# Altium schematic symbol library AA_Symbols.SchLib: 1017 symbols (part 5 of 7) (continued)
## Ind_Choke_CM_0.8A_310ohm_744222
designator L?, comment Manufacturer P/N: 744222  (hidden comment: 6k@100KHz, 0.8A)
Inductor, Choke, Common Mode, 800mA, 6000 Ohm, 744222; Manufacturer: Wurth Electronics; Outset P/N: PN-0001703; Value: 6k@100KHz, 0.8A
footprint 744222_CM_Choke (Chip Choke CM, Wurth, 744222)
pins: 1, 2, 3, 4

## Ind_Choke_CM_0.17A_35ohm_DLP11SA350HL2L
designator L?, comment Manufacturer P/N: DLP11SA350HL2L  (hidden comment: 35R@100MHz, 0.17A)
Inductor, Choke, Common Mode, 170mA, 35 Ohm, DLP11SA350HL2L; Manufacturer: Murata; Outset P/N: PN-0002774; Value: 35R@100MHz, 0.17A
footprint DFN125X100X92-4N (DFN,0.55mm pitch;4 pin,1.25mm L X 1.00mm W X 0.92mm H)
pins: 1, 2, 3, 4

## Ind_Choke_CM_1.5A_1000ohm_SRF0504-102Y
designator L?, comment SRF0504-102Y
Inductor, Choke, Common Mode, 1.5A, 1000 Ohm, SRF0504-102Y; Manufacturer: Bourns; Value: 1k@100KHz, 1.5A; Outset P/N: PN-0001658; Manufacturer P/N: SRF0504-102Y
footprint SRF0504 (SRF0504, 3.10 X 2.15 mm pitch; 4 pin, 5.00 mm L X 4.80 mm W X 4.70 mm H body)
pins: 1 IN1, 2 IN2, 3 OUT2, 4 OUT1

## Ind_Choke_CM_1.7A_1400ohm_4520
designator L?, comment ACM4520-142
Inductor, Choke, Common Mode, 1.7A, 1400 Ohm, 4520; Manufacturer: TDK; Manufacturer P/N: ACM4520-142-2P-T000; Outset P/N: 0000184
footprint ACM4520 (Inductor, Choke, Common Mode, 4520)
pins: 1 IN1, 2 IN2, 3 OUT2, 4 OUT1

## Ind_Choke_CM_5A_190ohm_2020
designator L?, comment DLW5BSN191SQ2L
Inductor, Choke, Common Mode, 5A, 190 Ohm, 2020; Manufacturer: Murata Electronics North America; Outset P/N: 0000187; Manufacturer P/N: DLW5BSN191SQ2L
footprint DLW5BS (SMD Ferrite Bead)
pins: 1 IN1, 2 OUT1, 3 OUT2, 4 IN2

## Ind_Choke_CM_5A_190ohm_SRF0504-102Y
designator L?, comment SRF0504-191Y
Inductor, Choke, Common Mode, 5A, 190 Ohm, SRF0504-191Y; Manufacturer: Bourns; Value: 190R@100KHz, 5A; Outset P/N: PN-0001833; Manufacturer P/N: SRF0504-191Y
footprint SRF0504 (SRF0504, 3.10 X 2.15 mm pitch; 4 pin, 5.00 mm L X 4.80 mm W X 4.70 mm H body)
pins: 1 IN1, 2 IN2, 3 OUT2, 4 OUT1

## Ind_Choke_CM_14.5A_4mH_8119
designator L?, comment CMT-8119 4mH 14.5A
Inductor, Choke, Common Mode, 14.5A, 4mH, 8119; Manufacturer: Bourns Inc.; Manufacturer P/N: 8119-RC; Value: 4 mH, 14.5A; Outset P/N: 0000185
footprint INDUCTOR_CMT8121 (Power Inductor)
pins: 1 IN1, 2 IN2, 3 OUT3, 4 OUT4

## INDUCTOR CHOKE RF HI CURR 820UH 10% RAD
designator L?, comment 820UH
Inductor, CHOKE RF HI CURR 820UH 10% RAD; Manufacturer: JW Miller A Bourns Company; Manufacturer P/N: 1140-821K-RC; Outset P/N: 0000176; Value: 820UH
footprint Choke_TH_1140-821K (Bourns, high current choke, 1140 series)
pins: 1, 2

## JUMPER
designator M?, comment SPC02SYAN  (mechanical)
2 (1 x 2) Position Shunt Connector Black Closed Top 0.100" (2.54mm) Gold; Manufacturer: Sullins Connector Solutions; Outset P/N: PN-0008392; Manufacturer P/N: 2 (1 x 2) Position Shunt Connector Black Closed Top 0.100" (2.54mm) Gold; Value: SPC02SYAN

## JUMPER_1
designator M?, comment SPC02SYAN  (mechanical)
2 (1 x 2) Position Shunt Connector Black Closed Top 0.100" (2.54mm) Gold; Manufacturer: Sullins Connector Solutions; Manufacturer P/N: 2 (1 x 2) Position Shunt Connector Black Closed Top 0.100" (2.54mm) Gold; Value: SPC02SYAN

## LED_Green_35mcd_2V_20mA_0603
designator D?, comment LTST-C191KGKT
LED, Green, 35mcd, 2V, 20mA; Manufacturer: Lite-On Inc; Outset P/N: 0000188; Manufacturer P/N: LTST-C191KGKT
footprint 0603_LED
pins: 1 A, 2 K

## LED_GRN_50mcd_2.2V_25mA_Thru
designator LED?, comment 50mcd, GRN
LED, Green, 50mcd, 2.2V, 25mA; Manufacturer: Lumex; Manufacturer P/N: SSF-LXH2300LGD-LM; Outset P/N: PN-0001661; Value: 50mcd, GRN
footprint NUV_SSF-LXH2300XXD-LM_TH2.25mm2pin (LED, 2.25 mm pitch; 2 pin,  11.00 mm L X 6.00 mm W X 7.1 mm H body)
footprint SSF-LXH2300LGD-LM_TH2.25mm2pin (LED, 2.25 mm pitch; 2 pin,  11.00 mm L X 6.00 mm W X 7.1 mm H body)
pins: 1 A, 2 K

## LED_GRN_SSF-LXH303GD
designator LED?, comment SSF-LXH303GD
LED T-3MM 565NM GREEN DIFF PCB, TH RA; Manufacturer: Lumex; Outset P/N: PN-0001687; Manufacturer P/N: SSF-LXH303GD; Value: SSF-LXH303GD
footprint LED_GRN_SSF-LXH303GD (TH, RA, LED)
pins: 1 A, 2 K

## LED_Red_35mcd_2V_20mA_0603
designator D?, comment LTST-C191KRKT
LED, Red, 35mcd, 2V, 20mA; Manufacturer: Lite-On Inc; Outset P/N: 0000189; Manufacturer P/N: LTST-C191KRKT
footprint 0603_LED
pins: 1 A, 2 K

## LED_RED_50mcd_2.0V_25mA_Thru
designator LED?, comment 50mcd, RED
LED, Red, 50mcd, 2.0V, 25mA; Manufacturer: Lumex; Manufacturer P/N: SSF-LXH2300LID-LM; Outset P/N: PN-0001662; Value: 50mcd, RED
footprint SSF-LXH2300LID-LM_TH2.25mm2pin (LED, 2.25 mm pitch; 2 pin,  11.00 mm L X 6.00 mm W X 7.1 mm H body)
pins: 1 A, 2 K

## LED_RED_SSF-LXH303ID
designator LED?, comment SSF-LXH303ID
LED T-3MM 635NM RED DIFF PCB, TH RA; Manufacturer: Lumex; Outset P/N: PN-0001686; Manufacturer P/N: SSF-LXH303ID; Value: SSF-LXH303ID
footprint LED_RED_SSF-LXH303ID (TH, RA, LED)
pins: 1 A, 2 K

## LED_YEL_50mcd_2.1V_30mA_Thru
designator LED?, comment 50mcd, YEL
LED, Yellow, 50mcd, 2.1V, 30mA; Manufacturer: Lumex; Manufacturer P/N: SSF-LXH2300YD-LM; Outset P/N: PN-0001663; Value: 50mcd, YEL
footprint NUV_SSF-LXH2300YD-LM_TH2.25mm2pin (LED, 2.25 mm pitch; 2 pin,  11.00 mm L X 6.00 mm W X 7.1 mm H body)
footprint SSF-LXH2300YD-LM_TH2.25mm2pin (LED, 2.25 mm pitch; 2 pin,  11.00 mm L X 6.00 mm W X 7.1 mm H body)
pins: 1 A, 2 K

## LED_YEL_5608F7
designator LED?, comment 5608F7
LED T-3MM 583NM YELLOW DIFF PCB, TH RA; Manufacturer: VCC; Outset P/N: PN-0001688; Manufacturer P/N: 5608F7; Value: 5608F7
footprint LED_YEL_VCC5608F7 (TH, RA, LED)
pins: 1 A, 2 K

## MAX_M10S
designator U?, comment MAX-M10S
SparkFun GNSS Receiver Breakout - MAX-M10S (Qwiic); Manufacturer: Sparkfun; Value: MAX-M10S; Manufacturer PN: MAX-M10S; Outset PN: *
pins: MH1, MH2, MH3, MH4

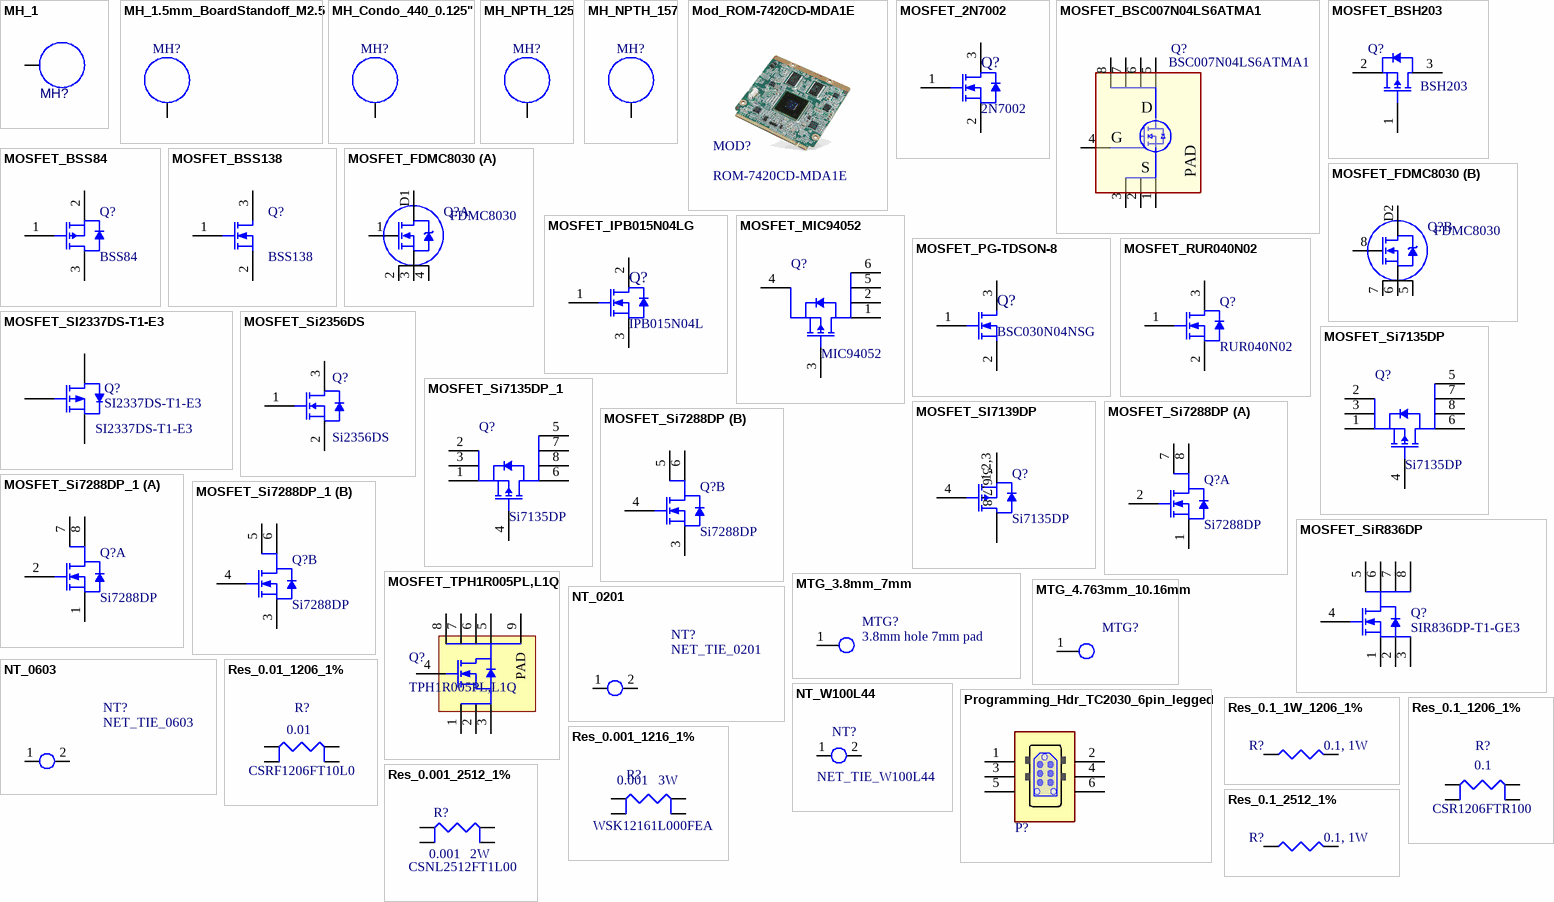
[diagram p29: symbols MH_1 to Res_0.1_2512_1%]

## MH_1
designator MH?  (no BOM)
pins: 1 MH

## MH_1.5mm_BoardStandoff_M2.5
designator MH?  (mechanical)
Mounting Hole, ROUND STANDOFF M2.5 STEEL 1.5MM; Manufacturer: Wurth Electronics; Manufacturer P/N: 9774015151R; Outset P/N: PN-0003780
footprint 9774015151R (ROUND STANDOFF M2.5 STEEL 1.5MM)
pins: 1 MH

## MH_Condo_440_0.125"
designator MH?  (no BOM)
Mounting Hole, Conductivity Sensor, 440 Screw, 0.125" Diameter
footprint MH_CONDO
pins: 1 MH

## MH_NPTH_125
designator MH?  (no BOM)
Mounting Hole, NPTH, 0.157" Diameter; Value: 125 Mils
footprint MH_NPTH_125 (Footprint not found)
pins: 1 MH

## MH_NPTH_157
designator MH?  (no BOM)
Mounting Hole, NPTH, 0.157" Diameter; Value: 157 Mils
footprint MH_NPTH_157 (Mounting Hole NPTH 157 mils)
pins: 1 MH

## Mod_ROM-7420CD-MDA1E
designator MOD?, comment ROM-7420CD-MDA1E  (mechanical)
Module, ROM-7420CD-MDA1E; Manufacturer: Advantech; Outset P/N: PN-0001677; Value: ROM-7420CD-MDA1E; Manufacturer P/N: ROM-7420CD-MDA1E
footprint ROM-7420CD-MDA1E (Footprint not found)

## MOSFET_2N7002
designator Q?, comment 2N7002
MOSFET, N-Channel,  Single, 60V, 115ma, SOT-23; Manufacturer: Fairchild Semiconductor; Outset P/N: 0000190; Manufacturer P/N: 2N7002
footprint SOT-23 (SOT-23; 3 Leads; Body 3.0 x 2.6 mm, inc. leads (LxW max))
pins: 1 G, 2 S, 3 D

## MOSFET_BSC007N04LS6ATMA1
designator Q?, comment BSC007N04LS6ATMA1
MOSFET, N-Channel, 40V, 381A, 188W, 20VGS, 0.7mOhm Max, Surface Mount, PG-TDSON-8-6; Manufacturer: Infineon Technologies; Outset P/N: PN-0007271; VALUE: BSC007N04LS6ATMA1; Temperature: -55C ~ 175C; Manufacturer P/N: BSC007N04LS6ATMA1
footprint BSC007N04LS6ATMA1
pins: 1 S, 2 S, 3 S, 4 G, 5 D, 6 D, 7 D, 8 D
text: PAD

## MOSFET_BSH203
designator Q?, comment BSH203
MOSFET, P-Channel, Single, 30V, 470mA, SOT-23; Manufacturer: NXP; Outset P/N: PN-0001776; Value: BSH203; Manufacturer P/N: BSH203
footprint BSH203 _SOT95P230X110-3L30N (Small Outline Transistor (SOT23), 0.95 mm pitch; 3 pin, 2.90 mm L X 1.30 mm W X 1.10 mm H body)
pins: 1 G, 2 S, 3 D

## MOSFET_BSS84
designator Q?, comment BSS84
MOSFET, P-Channel, Single, 50V, 130ma, SOT-23; Manufacturer: Fairchild Semiconductor; Outset P/N: 0000192; Manufacturer P/N: BSS84
footprint SOT-23 (SOT-23; 3 Leads; Body 3.0 x 2.6 mm, inc. leads (LxW max))
pins: 1 G, 2 S, 3 D

## MOSFET_BSS138
designator Q?, comment BSS138
MOSFET, N-Channel, 50V, 220mA, SOT-23; Manufacturer: Fairchild Semiconductor; Outset P/N: 0000191; Manufacturer P/N: BSS138
footprint SOT-23 (SOT23, 3-Leads, Body 3.0x2.7mm (max), Pitch 0.95mm, IPC Medium Density)
pins: 1, 2, 3

## MOSFET_FDMC8030
designator Q?, comment FDMC8030
MOSFET, 2 N-Channel (Dual), 40V, 12A, 2.8VGS, 10mOhm Max, Surface Mount, 8-PowerWDFN; Manufacturer: ON Semiconductor; Outset P/N: PN-0007281; Temperature: -55C ~ 150C; Manufacturer P/N: FDMC8030; VALUE: FDMC8030
footprint WDFN8_3x3_ONS_MFR
part A pins: 1 G1, 2 S1, 3 S1, 4 S1, D1
part B pins: 5 S2, 6 S2, 7 S2, 8 G2, D2

## MOSFET_IPB015N04LG
designator Q?, comment IPB015N04L
MOSFET, N-Channel,  Single, 40V, 120A, TO263-3; Manufacturer: Infineon; Manufacturer P/N: IPB015N04L G; Outset P/N: 0000193
footprint TO-263-3 (Mosfet N-channel)
pins: 1 G, 2 S, 3 D

## MOSFET_MIC94052
designator Q?, comment MIC94052
MOSFET, P-Channel, Single, 6V, 2A, SC70-6 Power; Manufacturer: Microchip Technology; Manufacturer P/N: MIC94052YC6-TR; Outset P/N: PN-0001738; Value: MIC94052
footprint MIC94052_SOP65P210X110-6L20N (Small Outline Pkg (SOP), 0.65 mm pitch; 6 pin, 2.00 mm L X 1.25 mm W X 1.10 mm H body)
pins: 1 D1, 2 D2, 3 G, 4 S, 5 D3, 6 D4

## MOSFET_PG-TDSON-8
designator Q?, comment BSC030N04NSG
MOSFET, N-Channel,  Single, 40V, 100A, TDSON-8; Manufacturer: Infineon; Outset P/N: 0000194; Manufacturer P/N: BSC030N04NSG
footprint PG-TDSON-8 (SOIC, 8-Leads, Body 6.35x5.35mm, Pitch 1.27mm, IPC Med Density)
pins: 1 G, 2 S, 3 D

## MOSFET_RUR040N02
designator Q?, comment RUR040N02
MOSFET, N-Channel, Single, 20V, 4A, SOT-23; Manufacturer: Rohm Semiconductor; Outset P/N: 0000195; Manufacturer P/N: RUR040N02
footprint SOT-23 (SOT-23; 3 Leads; Body 3.0 x 2.6 mm, inc. leads (LxW max))
pins: 1 G, 2 S, 3 D

## MOSFET_SI2337DS-T1-E3
designator Q?, comment SI2337DS-T1-E3
MOSFET, P-Channel, Single, 80V, 2.2A, SOT23-3; Manufacturer: Vishay Siliconix; Outset P/N: PN-0007131; Manufacturer P/N: SI2337DS-T1-E3; VALUE: SI2337DS-T1-E3
footprint SOT95P240X120-3N (TO-236)
pins: 1 G, 2 S, 3 D

## MOSFET_Si2356DS
designator Q?, comment Si2356DS
MOSFET, N-Channel, Single, 40V, 4A, SOT-23; Manufacturer: Vishay; Manufacturer P/N: SI2356DS-T1-GE3; Value: Si2356DS
footprint SOT-23 (SOT-23; 3 Leads; Body 3.0 x 2.6 mm, inc. leads (LxW max))
pins: 1 G, 2 S, 3 D

## MOSFET_Si7135DP
designator Q?, comment Si7135DP
MOSFET, P-Channel, Single, 30V, 60A, SO-8 Power; Manufacturer: Vishay/Siliconix; Manufacturer P/N: SI7135DP-T1-GE3; Outset P/N: 0000197
footprint SO-8_PowerPaK_single (8 pin, PowerPak)
pins: 1 S1, 2 S2, 3 S3, 4 G, 5 D1, 6 D2, 7 D3, 8 D4

## MOSFET_Si7135DP_1
designator Q?, comment Si7135DP
MOSFET, P-Channel, Single, 30V, 60A, SO-8 Power; Manufacturer: Vishay/Siliconix; Manufacturer P/N: SI7135DP-T1-GE3; Outset P/N: PN-0000197
footprint SO-8_PowerPaK_single (8 pin, PowerPak)
pins: 1 S1, 2 S2, 3 S3, 4 G, 5 D1, 6 D2, 7 D3, 8 D4

## MOSFET_SI7139DP
designator Q?, comment Si7135DP
MOSFET, P-Channel, Single, 30V, 40A, SO-8 Power; Manufacturer: Vishay; Manufacturer P/N: SI7139DP-T1-GE3; Outset P/N: 0000196
footprint SO-8_PowerPaK_single (8 pin, PowerPak)
pins: 1 S1, 2 S2, 3 S3, 4 G, 5 D1, 6 D2, 7 D3, 8 D4
text: 1,2,3; 5,6,7,8

## MOSFET_Si7288DP
designator Q?, comment Si7288DP
MOSFET, N-Channel, Dual, 40V, 20A, SO-8 Power; Manufacturer: Vishay/Siliconix; Manufacturer P/N: SI7288DP-T1-GE3; Outset P/N: 0000198
footprint SO-8_PowerPak (8 pin, PowerPak)
part A pins: 1 S1, 2 G1, 7 D1, 8 D1
part B pins: 3 S2, 4 G2, 5 D2, 6 D2

## MOSFET_Si7288DP_1
designator Q?, comment Si7288DP
MOSFET, N-Channel, Dual, 40V, 20A, SO-8 Power; Manufacturer: Vishay/Siliconix; Manufacturer P/N: SI7288DP-T1-GE3; Outset P/N: PN-0000198
footprint SO-8_PowerPak (8 pin, PowerPak)
part A pins: 1 S1, 2 G1, 7 D1, 8 D1
part B pins: 3 S2, 4 G2, 5 D2, 6 D2

## MOSFET_SiR836DP
designator Q?, comment SIR836DP-T1-GE3
MOSFET, N-Channel, 40V, 21A, SO-8 Power; Manufacturer: Vishay/Siliconix; Outset P/N: PN-0002756; Manufacturer P/N: SIR836DP-T1-GE3; Value: SIR836DP-T1-GE3
footprint SO-8_PowerPaK_single (8 pin, PowerPak)
pins: 1 S1, 2 S1, 3 S1, 4 G1, 5 D1, 6 D1, 7 D1, 8 D1

## MOSFET_TPH1R005PL,L1Q
designator Q?, comment TPH1R005PL,L1Q
MOSFET, N-Channel, Single, 45V, 150A, Surface Mount; Manufacturer: Toshiba; Outset P/N: PN-0001664; Value: TPH1R005PL,L1Q; Manufacturer P/N: TPH1R005PL,L1Q
footprint NUV_TPH1R005PL,L1Q_SOTFL127P600X100-8N (Small Outline Transistor Flat Lead (SOP Advance), 1.27 mm pitch; 8 pin, 5.0 mm L X 5.0 mm W X 1.0 mm H body)
footprint TPH1R005PL,L1Q_SOTFL127P600X100-8N (Small Outline Transistor Flat Lead (SOP Advance), 1.27 mm pitch; 8 pin, 5.0 mm L X 5.0 mm W X 1.0 mm H body)
pins: 1 S, 2 S, 3 S, 4 G, 5 D, 6 D, 7 D, 8 D, 9 PAD

## MTG_3.8mm_7mm
designator MTG?, comment 3.8mm hole 7mm pad  (no BOM)
Mounting hole, 3.8 mm hole, 7 mm pad; Manufacturer: Nuvation; Value: 3.8mm hole 7mm pad
footprint MTG_3.8mm_7.0mm (Mounting hole, 3.8 mm hole,  7mm pad)
pins: 1

## MTG_4.763mm_10.16mm
designator MTG?, comment MTG HOLE  (value not drawn)  (no BOM)
Mounting hole, 4.763 mm hole, 10.16 mm pad; Manufacturer: Nuvation; Value: MTG HOLE
footprint MTG_4.763mm_10.16mm (Mounting hole, 4.763 mm hole, 10.16 mm pad)
pins: 1

## NT_0201
designator NT?, comment NET_TIE_0201  (net tie, no BOM)
Net Tie, 0201 Resistor sized; Manufacturer: Nuvation; Outset P/N: PN-0001665; Manufacturer P/N: NET_TIE_0201
footprint NUV_NET_TIE_0201 (Footprint not found)
footprint NET_TIE_0201 (Net Tie, 2-Leads, Body 0.6x0.3mm, IPC Medium Density)
pins: 1, 2

## NT_0603
designator NT?, comment NET_TIE_0603  (net tie, no BOM)
Net Tie, 0603 Resistor sized; Manufacturer: Nuvation; Outset P/N: PN-0001666; Manufacturer P/N: NET_TIE_0603
footprint NUV_NET_TIE_0603 (Footprint not found)
footprint NET_TIE_0603
pins: 1, 2

## NT_W100L44
designator NT?, comment NET_TIE_W100L44  (net tie, no BOM)
Net Tie, 100 x 44 mils ( W x L); Manufacturer: Nuvation; Outset P/N: PN-0001783; Manufacturer P/N: NET_TIE_W100L44
footprint NET_TIE_W100L44 (Net Tie, 100mils x 44mils)
pins: 1, 2

## Programming_Hdr_TC2030_6pin_legged
designator P?, comment Footprint for TC2030  (value not drawn)  (no BOM)
LAND-PATTERN FOR TAG-CONNECT TC2030 WITH LEGS; VALUE: Footprint for TC2030
footprint CONN_TC2030 (Landpattern)
footprint CONN_TC2030-NL
pins: 1, 2, 3, 4, 5, 6

## Res_0.1_1W_1206_1%
designator R?, comment 0.1, 1W
RES 0.1 OHM 1% 1W 1206; Manufacturer: YAGEO; Manufacturer P/N: PE1206FRF470R1L; Outset P/N: PN-0007517; Value: 0.1, 1W
footprint RC_3216_1206_N (Chip Resistor, 2-Leads, Body 3.2x1.6mm, IPC Medium Density)
pins: 1, 2

## Res_0.01_1206_1%
designator R?, comment Manufacturer P/N: CSRF1206FT10L0  (hidden comment: 0.01)
Resistor, 0.01, 1206, 1%, 1W; Manufacturer: Stackpole Electronics Inc; Outset P/N: PN-0007424; TOLERANCE: 1%; POWER: 1W; VALUE: 0.01
footprint RC_3216_1206_N_CUR_SENSE
pins: 1,2, 3,4, S1, S2

## Res_0.1_1206_1%
designator R?, comment Manufacturer P/N: CSR1206FTR100  (hidden comment: 0.1)
Res, 0.1, 1206, 1%, 1/2W; Manufacturer: Stackpole Electronics Inc; Outset P/N: PN-0007139; POWER: 0.5W; TOLERANCE: 1%; VALUE: 0.1
footprint RC_3216_1206_N_CUR_SENSE
pins: 1,2, 3,4, S1, S2

## Res_0.001_1216_1%
designator R?, comment POWER: 3W  Manufacturer P/N: WSK12161L000FEA  (hidden comment: 0.001)
Resistor, 0.001, 1216, 1%, 3W, Current Sense; Manufacturer: Vishay Dale; Outset P/N: PN-0007278; TempCo: 50ppm/C; TOLERANCE: 1%; VALUE: 0.001
footprint RC_6332_2512_N_CUR_SENSE (Chip Resistor, 2-Leads, Body 6.3x3.2mm, IPC Medium Density)
footprint WSK1216 (WSK1216  resistor - per MFR footprint)
pins: 1, 2, 3, 4

## Res_0.001_2512_1%
designator R?, comment POWER: 2W  Manufacturer P/N: CSNL2512FT1L00  (hidden comment: 0.001)
Resistor, 0.001, 2512, 1%, 2W, Current Sense; Manufacturer: Stackpole Electronics Inc; Outset P/N: PN-0007267; TempCo: 50ppm/C; TOLERANCE: 1%; Temperature: -55C ~ 170C; Value: 0.001
footprint RC_6332_2512_N_CUR_SENSE (Chip Resistor, 2-Leads, Body 6.3x3.2mm, IPC Medium Density)
pins: 1,2, 3,4, S1, S2

## Res_0.1_2512_1%
designator R?, comment 0.1, 1W
RES 0.1 OHM 1% 1W 2512; Manufacturer: YAGEO; Manufacturer P/N: PT2512FK-070R1L; Value: 0.1, 1W
footprint RC_6332_2512_N (Chip Resistor, 2-Leads, Body 6.3x3.2mm, IPC Medium Density)
pins: 1, 2

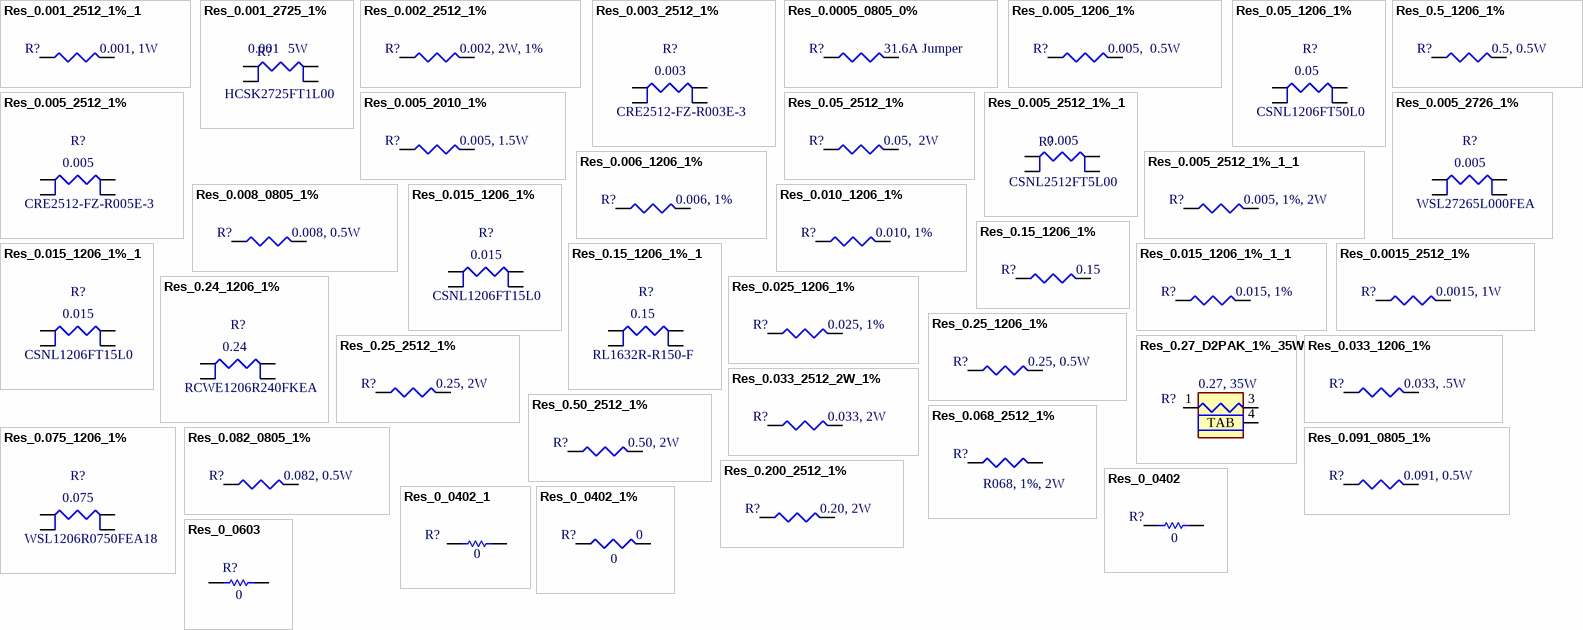
[diagram p30: symbols Res_0.001_2512_1%_1 to Res_0_0603]

## Res_0.001_2512_1%_1
designator R?, comment 0.001, 1W
Resistor, 0.001, 2512, 1%, 1W; Manufacturer: Panasonic Electronic Components; Manufacturer P/N: ERJ-M1WTF1M0U; Outset P/N: 0000205; Value: 0.001, 1W
footprint 2512_RHC
pins: 1, 2

## Res_0.001_2725_1%
designator R?, comment POWER: 5W  Manufacturer P/N: HCSK2725FT1L00  (hidden comment: 0.001)
Resistor, 0.001, 2725, 1%, 5W, Current Sense; Manufacturer: Stackpole Electronics Inc; Outset P/N: PN-0007273; TempCo: 50ppm/C; TOLERANCE: 1%; VALUE: 0.001
footprint HCSK2725_STP
pins: 1, 2, S1, S2

## Res_0.002_2512_1%
designator R?, comment 0.002, 2W, 1%
Resistor, 0.002, 2512, 2W, 1%; Manufacturer: Stackpole Electronics Inc.; Manufacturer P/N: CSNL2512FT2L00; Outset P/N: PN-0001715; Value: 0.002, 2W, 1%
footprint RC_6332_2512_N (Chip Resistor, 2-Leads, Body 6.3x3.2mm, IPC Medium Density)
pins: 1, 2

## Res_0.003_2512_1%
designator R?, comment Manufacturer P/N: CRE2512-FZ-R003E-3  (hidden comment: 0.003)
Resistor, 0.003, 2512, 1%, 3W; Manufacturer: Bourns Inc.; Outset P/N: PN-0007512; TOLERANCE: 1%; POWER: 3W; VALUE: 0.003
footprint RC_6332_2512_N_CUR_SENSE (Chip Resistor, 2-Leads, Body 6.3x3.2mm, IPC Medium Density)
pins: 1,2, 3,4, S1, S2

## Res_0.0005_0805_0%
designator R?, comment 31.6A Jumper
Resistor, 0.0005, 0805, 0%; Manufacturer: Stackpole; Manufacturer P/N: HCJ0805ZT0R00; Outset P/N: PN-0001750; Value: 31.6A Jumper
footprint RC_2012_0805_N (Chip Resistor, 2-Leads, Body 2.0x1.3mm, IPC Medium Density)
pins: 1, 2

## Res_0.005_1206_1%
designator R?, comment 0.005,  0.5W
Resistor, 0.005, 1206, 1%, 0.5W; Manufacturer: Stackpole; Manufacturer P/N: CSRF1206FT5L00; Outset P/N: 0000206; Value: 0.005,  0.5W
footprint RC_3216_1206_N
pins: 1, 2

## Res_0.05_1206_1%
designator R?, comment Manufacturer P/N: CSNL1206FT50L0  (hidden comment: 0.05)
Resistor, 0.05, 1206, 1%, 1W; Manufacturer: Stackpole Electronics Inc; Outset P/N: PN-0007401; TOLERANCE: 1%; POWER: 1W; VALUE: 0.05
footprint RC_3216_1206_N_CUR_SENSE
pins: 1,2, 3,4, S1, S2

## Res_0.5_1206_1%
designator R?, comment 0.5, 0.5W
Resistor, 0.5,1206, 1%, 0.5W; Manufacturer: Stackpole Electronics Inc; Manufacturer P/N: CSR1206FKR500; Outset P/N: 0000217; Value: 0.5, 0.5W
footprint RC_3216_1206_N
pins: 1, 2

## Res_0.005_2010_1%
designator R?, comment 0.005, 1.5W
Resistor, 0.005, 2010, 1%, 1.5W; Manufacturer: Stackpole; Manufacturer P/N: CSNL2010FT5L00; Outset P/N: 0000207; Value: 0.005, 1.5W
footprint RESC5025N (Chip Resistor, Body 5.0x2.5mm, IPC Medium Density)
pins: 1, 2

## Res_0.005_2512_1%
designator R?, comment Manufacturer P/N: CRE2512-FZ-R005E-3  (hidden comment: 0.005)
Resistor, 0.005, 2512, 1%, 3W; Manufacturer: Bourns Inc.; Outset P/N: PN-0007449; TOLERANCE: 1%; POWER: 3W; VALUE: 0.005
footprint RC_6332_2512_N_CUR_SENSE (Chip Resistor, 2-Leads, Body 6.3x3.2mm, IPC Medium Density)
pins: 1,2, 3,4, S1, S2

## Res_0.05_2512_1%
designator R?, comment 0.05,  2W
Resistor, 0.05, 2512, 1%, 2W; Manufacturer: Stackpole; Manufacturer P/N: CSRN2512FK50L0; Outset P/N: 0000210; Value: 0.05,  2W
footprint RC_6332_2512_N
pins: 1, 2

## Res_0.005_2512_1%_1
designator R?, comment Manufacturer P/N: CSNL2512FT5L00  (hidden comment: 0.005)
Resistor, 0.005, 2512, 1%, 2W, Current Sense; Manufacturer: Stackpole Electronics Inc; Outset P/N: PN-0007276; TempCo: 50ppm/C; TOLERANCE: 1%; POWER: 2W; VALUE: 0.005
footprint RC_6332_2512_N_CUR_SENSE (Chip Resistor, 2-Leads, Body 6.3x3.2mm, IPC Medium Density)
pins: 1,2, 3,4, S1, S2

## Res_0.005_2512_1%_1_1
designator R?, comment 0.005, 1%, 2W
Resistor, 0.005, 2512, 1%, 2W; Manufacturer: Stackpole; Manufacturer P/N: CSNL2512FT5L00; Outset P/N: PN-0001789; Value: 0.005, 1%, 2W
footprint RC_6332_2512_N (Chip Resistor, 2-Leads, Body 6.3x3.2mm, IPC Medium Density)
pins: 1, 2

## Res_0.005_2726_1%
designator R?, comment Manufacturer P/N: WSL27265L000FEA  (hidden comment: 0.005)
Resistor, 0.005, 2726, 1%, 3W; Manufacturer: Vishay Dale; Outset P/N: PN-0007450; TOLERANCE: 1%; POWER: 3W; VALUE: 0.005
footprint RC_2726_N (WSL27265L000 resistor - per MFR footprint)
pins: 1, 2, S1, S2

## Res_0.006_1206_1%
designator R?, comment 0.006, 1%
Resistor, 0.006, 1206, 1%; Manufacturer: Yageo; Manufacturer P/N: PR1206FKE7W0R006Z; Outset P/N: PN-0001708; Value: 0.006, 1%
footprint RC_3216_1206_N (Chip Resistor, 2-Leads, Body 3.2x1.6mm, IPC Medium Density)
pins: 1, 2

## Res_0.008_0805_1%
designator R?, comment 0.008, 0.5W
Resistor, 0.008, 0805, 1%, .5W; Manufacturer: Rohm Semiconductor; Manufacturer P/N: PMR10EZPFU8L00; Outset P/N: 0000208; Value: 0.008, 0.5W
footprint RC_2012_0805_N
pins: 1, 2

## Res_0.010_1206_1%
designator R?, comment 0.010, 1%
Resistor, 0.010, 1206, 1%; Manufacturer: Stackpole; Manufacturer P/N: CSNL1206FT10L0; Outset P/N: PN-0001727; Value: 0.010, 1%
footprint RC_3216_1206_N (Chip Resistor, 2-Leads, Body 3.2x1.6mm, IPC Medium Density)
pins: 1, 2

## Res_0.015_1206_1%
designator R?, comment Manufacturer P/N: CSNL1206FT15L0  (hidden comment: 0.015)
Resistor, 0.015, 1206, 1%, 1W; Manufacturer: Stackpole Electronics Inc; TOLERANCE: 1%; POWER: 1W; VALUE: 0.015
footprint RC_3216_1206_N_CUR_SENSE
pins: 1,2, 3,4, S1, S2

## Res_0.15_1206_1%
designator R?, comment 0.15
Resistor, 0.15, 1206, 1%, 0.5W; Manufacturer: Susumu; Manufacturer P/N: RL1632R-R150-F; Outset P/N: PN-0007403; Value: 0.15
footprint RC_3216_1206_N
pins: 1, 2

## Res_0.015_1206_1%_1
designator R?, comment Manufacturer P/N: CSNL1206FT15L0  (hidden comment: 0.015)
Resistor, 0.015, 1206, 1%, 1W; Manufacturer: Stackpole Electronics Inc; Outset P/N: PN-0007138; TOLERANCE: 1%; POWER: 1W; VALUE: 0.015
footprint RC_3216_1206_N_CUR_SENSE
pins: 1,2, 3,4, S1, S2

## Res_0.15_1206_1%_1
designator R?, comment Manufacturer P/N: RL1632R-R150-F  (hidden comment: 0.15)
Resistor, 0.15, 1206, 1%, 0.5W; Manufacturer: Susumu; Outset P/N: PN-0007403; TOLERANCE: 1%; POWER: 0.5W; VALUE: 0.15
footprint RC_3216_1206_N_CUR_SENSE
pins: 1,2, 3,4, S1, S2

## Res_0.015_1206_1%_1_1
designator R?, comment 0.015, 1%
Resistor, 0.015, 1206, 1%; Manufacturer: Stackpole; Manufacturer P/N: CSNL1206FT15L0; Outset P/N: PN-0001681; Value: 0.015, 1%
footprint RC_3216_1206_N (Chip Resistor, 2-Leads, Body 3.2x1.6mm, IPC Medium Density)
pins: 1, 2

## Res_0.0015_2512_1%
designator R?, comment 0.0015, 1W
Resistor, 0.0015, 2512, 1%, 1W; Manufacturer: Panasonic Electronic Components; Manufacturer P/N: ERJ-M1WTF1M5U; Outset P/N: 0000204; Value: 0.0015, 1W
footprint 2512_RHC
pins: 1, 2

## Res_0.24_1206_1%
designator R?, comment Manufacturer P/N: RCWE1206R240FKEA  (hidden comment: 0.24)
Resistor, 0.24, 1206, 1%, 0.5W; Manufacturer: Vishay Dale; Outset P/N: PN-0007404; TOLERANCE: 1%; POWER: 0.5W; VALUE: 0.24
footprint RC_3216_1206_N_CUR_SENSE
pins: 1,2, 3,4, S1, S2

## Res_0.025_1206_1%
designator R?, comment 0.025, 1%
Resistor, 0.025, 1206, 1%; Manufacturer: Stackpole Electronics; Manufacturer P/N: CSNL1206FT25L0; Outset P/N: PN-0001668; Value: 0.025, 1%
footprint RC_3216_1206_N (Chip Resistor, 2-Leads, Body 3.2x1.6mm, IPC Medium Density)
pins: 1, 2

## Res_0.25_1206_1%
designator R?, comment 0.25, 0.5W
Resistor, 0.25, 1206, 1%, 0.5W; Manufacturer: Stackpole Electronics Inc; Manufacturer P/N: CSR1206FKR250; Outset P/N: PN-0002788; Value: 0.25, 0.5W
footprint RC_3216_1206_N
pins: 1, 2

## Res_0.25_2512_1%
designator R?, comment 0.25, 2W
Resistor, 0.25, 2512, 1%, 2W; Manufacturer: Stackpole Electronics Inc; Manufacturer P/N: CSRN2512FKR250; Outset P/N: 0000214; Value: 0.25, 2W
footprint RC_6332_2512_N
pins: 1, 2

## Res_0.27_D2PAK_1%_35W
designator R?, comment 0.27, 35W
Resistor, 0.27, D2PAK, 1%, 35W; Manufacturer: Bourns Inc; Manufacturer P/N: PWR263S-35-R270F; Outset P/N: 0000215; Value: 0.27, 35W
footprint D2PAK (D2-PAK, 3-Pads, Body 9.6x10.7mm (max), IPC Medium Density)
pins: 1, 3, 4 TAB

## Res_0.033_1206_1%
designator R?, comment 0.033, .5W
Resistor, 0.033 ,1206, 1%, 0.5W; Manufacturer: Panasonic Electronic Components; Manufacturer P/N: ERJ-8BWFR033V; Outset P/N: 0000209; Value: 0.033, .5W
footprint RC_3216_1206_N
pins: 1, 2

## Res_0.033_2512_2W_1%
designator R?, comment 0.033, 2W
Resistor, 0.033 ,2512, 1%, 2W; Manufacturer: Yageo; Manufacturer P/N: PE2512FKE7W0R033L; Outset P/N: PN-0001425; Value: 0.033, 2W
footprint RC_6332_2512_N (Chip Resistor, 2-Leads, Body 6.3x3.2mm, IPC Medium Density)
pins: 1, 2

## Res_0.50_2512_1%
designator R?, comment 0.50, 2W
Resistor, 0.50, 2512, 1%, 2W; Manufacturer: Stackpole Electronics Inc; Manufacturer P/N: CSRN2512FKR500; Outset P/N: 0000216; Value: 0.50, 2W
footprint RC_6332_2512_N
pins: 1, 2

## Res_0.068_2512_1%
designator R?, comment R068, 1%, 2W
Resistor, 0.068, 2512, 1%; Manufacturer: Stackpole; Manufacturer P/N: CSRN2512FK68L0; Outset P/N: PN-0001734; Value: R068, 1%, 2W
footprint RC_6332_2512_N (Chip Resistor, 2-Leads, Body 6.3x3.2mm, IPC Medium Density)
pins: 1, 2

## Res_0.075_1206_1%
designator R?, comment Manufacturer P/N: WSL1206R0750FEA18  (hidden comment: 0.075)
Resistor, 0.075, 1206, 1%, 0.5W; Manufacturer: Vishay Dale; Outset P/N: PN-0007402; TOLERANCE: 1%; POWER: 0.5W; VALUE: 0.075
footprint RC_3216_1206_N_CUR_SENSE
pins: 1,2, 3,4, S1, S2

## Res_0.082_0805_1%
designator R?, comment 0.082, 0.5W
Resistor, 0.082, 0805, 1%, 0.5W; Manufacturer: Susumu; Manufacturer P/N: KRL1220E-M-R082-F-T5; Outset P/N: 0000211; Value: 0.082, 0.5W
footprint RC_2012_0805_N
pins: 1, 2

## Res_0.091_0805_1%
designator R?, comment 0.091, 0.5W
Resistor, 0.091, 0805, 1%, 0.5W; Manufacturer: Rohm Semiconductor; Manufacturer P/N: LTR10EVHFSR082; Outset P/N: 0000212; Value: 0.091, 0.5W
footprint RC_2012_0805_N
pins: 1, 2

## Res_0.200_2512_1%
designator R?, comment 0.20, 2W
Resistor, 0.200 2512, 1%, 2W; Manufacturer: Bourns; Manufacturer P/N: CRM2512-FX-R200ELF; Outset P/N: 0000213; Value: 0.20, 2W
footprint RC_6332_2512_N (Chip Resistor, 2-Leads, Body 6.3x3.2mm, IPC Medium Density)
pins: 1, 2

## Res_0_0402
designator R?, comment 0
Resistor, 0, 0402, 1/10W; Manufacturer P/N: ERJ-2GE0R00X; Manufacturer: Panasonic-ECG; Outset P/N: PN-0007116; POWER: 1/10W; Value: 0
footprint RC_1005_0402_L
pins: 1, 2

## Res_0_0402_1
designator R?, comment 0
Resistor, 0, 0402, 1/10W; Manufacturer P/N: ERJ-2GE0R00X; Manufacturer: Panasonic-ECG; Outset P/N: PN-0007266; POWER: 1/10W; Value: 0
footprint RC_1005_0402_L
footprint RC_1005_0402_N
pins: 1, 2

## Res_0_0402_1%
designator R?, comment 0
Resistor, 0, 0402, 1%; Manufacturer: Yageo; Manufacturer P/N: RC0402JR-070RL; Outset P/N: PN-0001454; Value: 0
footprint RC_1005_0402_N (Chip Resistor, 2-Leads, Body 1.0x0.5mm, IPC Medium Density)
pins: 1, 2

## Res_0_0603
designator R?, comment 0
Resistor, 0, 0603, 1/10W; Manufacturer P/N: ERJ-3GEY0R00V; Manufacturer: Panasonic-ECG; Outset P/N: PN-0007119; POWER: 1/10W; Value: 0
footprint RC_1608_0603_N
footprint RC_1608_0603_L
pins: 1, 2

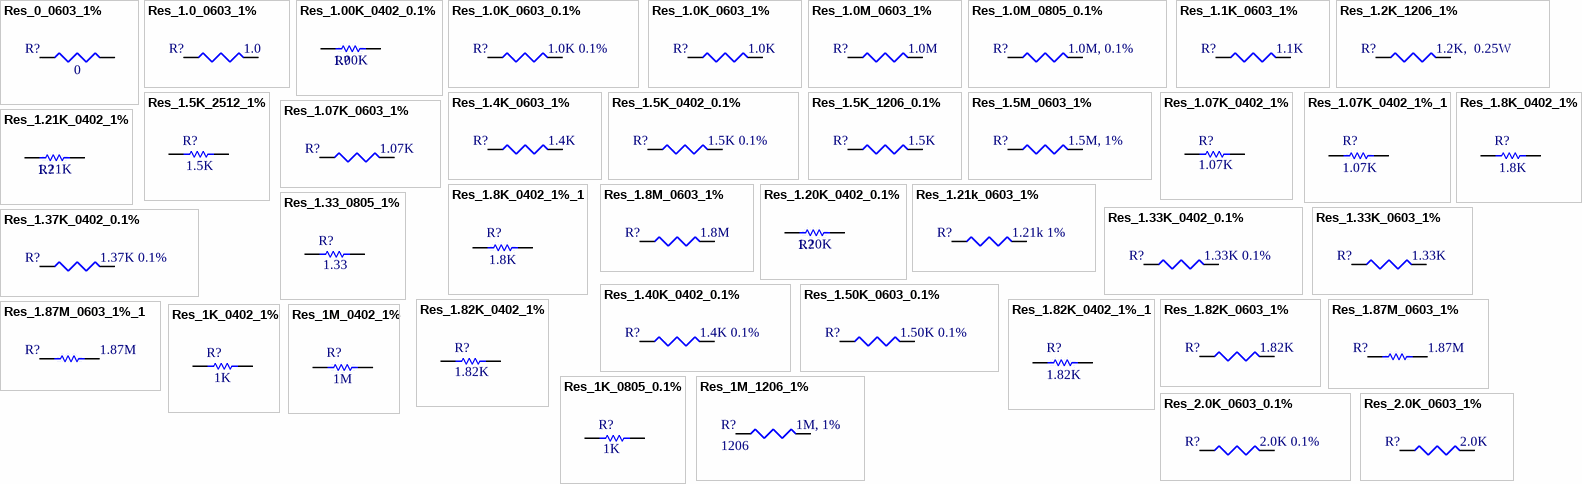
[diagram p31: symbols Res_0_0603_1% to Res_2.0K_0603_1%]

## Res_0_0603_1%
designator R?, comment 0
Resistor, 0, 0603, 1%; Manufacturer: Stackpole; Manufacturer P/N: RMCF0603ZT0R00; Outset P/N: 0000218; Value: 0
footprint RC_1608_0603_N
pins: 1, 2

## Res_1.0_0603_1%
designator R?, comment 1.0
Resistor, 1.0, 0603, 1%; Manufacturer: Stackpole Electronics Inc; Manufacturer P/N: RMCF0603FT1R00; Outset P/N: 0000224; Value: 1.0
footprint RC_1608_0603_N
pins: 1, 2

## Res_1.00K_0402_0.1%
designator R?, comment 1.00K
Resistor, 1.00K, 0402, 0.1%, 1/16W; Manufacturer P/N: RT0402BRE071KL; Manufacturer: YAGEO; TempCo: 50ppm/C; Outset P/N: *; TOLERANCE: 0.1%; POWER: 1/16W; Value: 1.00K
footprint RC_1005_0402_L
pins: 1, 2

## Res_1.0K_0603_0.1%
designator R?, comment 1.0K 0.1%
Resistor, 1.0K, 0603, 0.1%; Manufacturer: TE Connectivity; Manufacturer P/N: 1614882-3; Outset P/N: 0000220; Value: 1.0K 0.1%
footprint RC_1608_0603_N
pins: 1, 2

## Res_1.0K_0603_1%
designator R?, comment 1.0K
Resistor, 1.0K, 0603, 1%; Manufacturer: Stackpole; Manufacturer P/N: RMCF0603FT1K00; Outset P/N: 0000221; Value: 1.0K
footprint RC_1608_0603_N
pins: 1, 2

## Res_1.0M_0603_1%
designator R?, comment 1.0M
Resistor, 1.0M, 0603, 1%; Manufacturer: Stackpole; Manufacturer P/N: RMCF0603FT1M00; Outset P/N: 0000222; Value: 1.0M
footprint RC_1608_0603_N
pins: 1, 2

## Res_1.0M_0805_0.1%
designator R?, comment 1.0M, 0.1%
Resistor, 1.0M, 0805, 0.1%; Manufacturer: Panasonic; Manufacturer P/N: ERA-6AEB105V; Outset P/N: 0000223; Value: 1.0M, 0.1%
footprint RC_2012_0805_N
pins: 1, 2

## Res_1.1K_0603_1%
designator R?, comment 1.1K
Resistor, 1.1K, 0603, 1%; Manufacturer: Stackpole Electronics Inc; Manufacturer P/N: RMCF0603FT1K10; Outset P/N: 0000225; Value: 1.1K
footprint RC_1608_0603_N
pins: 1, 2

## Res_1.2K_1206_1%
designator R?, comment 1.2K,  0.25W
Resistor, 1.20K, 1206, 1%, 0.5W; Manufacturer: Vishay Dale; Manufacturer P/N: CRCW12061K20FKEAHP; Outset P/N: 0000226; Value: 1.2K,  0.25W
footprint RC_3216_1206_N
pins: 1, 2

## Res_1.4K_0603_1%
designator R?, comment 1.4K
Resistor, 1.4K, 0603, 1%; Manufacturer: Panasonic; Manufacturer P/N: ERJ-3EKF1401V; Outset P/N: 0000228; Value: 1.4K
footprint RC_1608_0603_N
pins: 1, 2

## Res_1.5K_0402_0.1%
designator R?, comment 1.5K 0.1%
Resistor, 1.5K, 0402, 0.1%; Manufacturer: Panasonic; Manufacturer P/N: ERA-2AEB152X; Outset P/N: PN-0002072; Value: 1.5K 0.1%
footprint RC_1005_0402_N (Chip Resistor, 2-Leads, Body 1.0x0.5mm, IPC Medium Density)
pins: 1, 2

## Res_1.5K_1206_0.1%
designator R?, comment 1.5K
Resistor, 1.5K, 1206, 0.1%, 1W; Manufacturer: Susumu; Manufacturer P/N: HRG3216P-1501-B-T1; Outset P/N: PN-0007437; Value: 1.5K
footprint RC_3216_1206_N
pins: 1, 2

## Res_1.5K_2512_1%
designator R?, comment 1.5K
Resistor, 1.5K, 2512, 1%, 2W; Manufacturer P/N: 35211K5FT; Manufacturer: TE Connectivity Passive Product; Outset P/N: PN-0007277; TempCo: 100ppm/C; POWER: 2W; TOLERANCE: 1%; Value: 1.5K
footprint RC_6332_2512_N
pins: 1, 2

## Res_1.5M_0603_1%
designator R?, comment 1.5M, 1%
Resistor, 1.5M, 0603, 1%; Manufacturer: Vishay; Manufacturer P/N: CRCW06031M50FKEA; Outset P/N: PN-0002787; Value: 1.5M, 1%
footprint RC_1608_0603_N (Chip Resistor, 2-Leads, Body 1.5x0.8mm, IPC Medium Density)
pins: 1, 2

## Res_1.07K_0402_1%
designator R?, comment 1.07K
Resistor, 1.07K, 0402, 1%, 1/10W; Manufacturer P/N: ERJ-2RKF1071X; Manufacturer: Panasonic-ECG; Outset P/N: PN-0007233; TempCo: 100ppm/C; TOLERANCE: 1%; POWER: 1/10W; Value: 1.07K
footprint RC_1005_0402_L
footprint RC_1005_0402_N
pins: 1, 2

## Res_1.07K_0402_1%_1
designator R?, comment 1.07K
Resistor, 1.07K, 0402, 1%, 1/10W; Manufacturer P/N: ERJ-2RKF1071X; Manufacturer: Panasonic; Outset P/N: PN-0007066; TempCo: 100ppm/C; TOLERANCE: 1%; POWER: 1/10W; Value: 1.07K
footprint RC_1005_0402_L
pins: 1, 2